# Altium footprint library 智能锁实践教学平台.PcbLib: 58 footprints (part 1 of 4)
Each footprint in its own frame and in the unit in brackets; x right, y up, seen from the top. Pads: shape width x height; smd on the part's side, far side on the other; paste and mask are expansions set on the pad; w line width, h text height; cw(c..) or ccw(c..) is an arc to the next point about the centre after c.
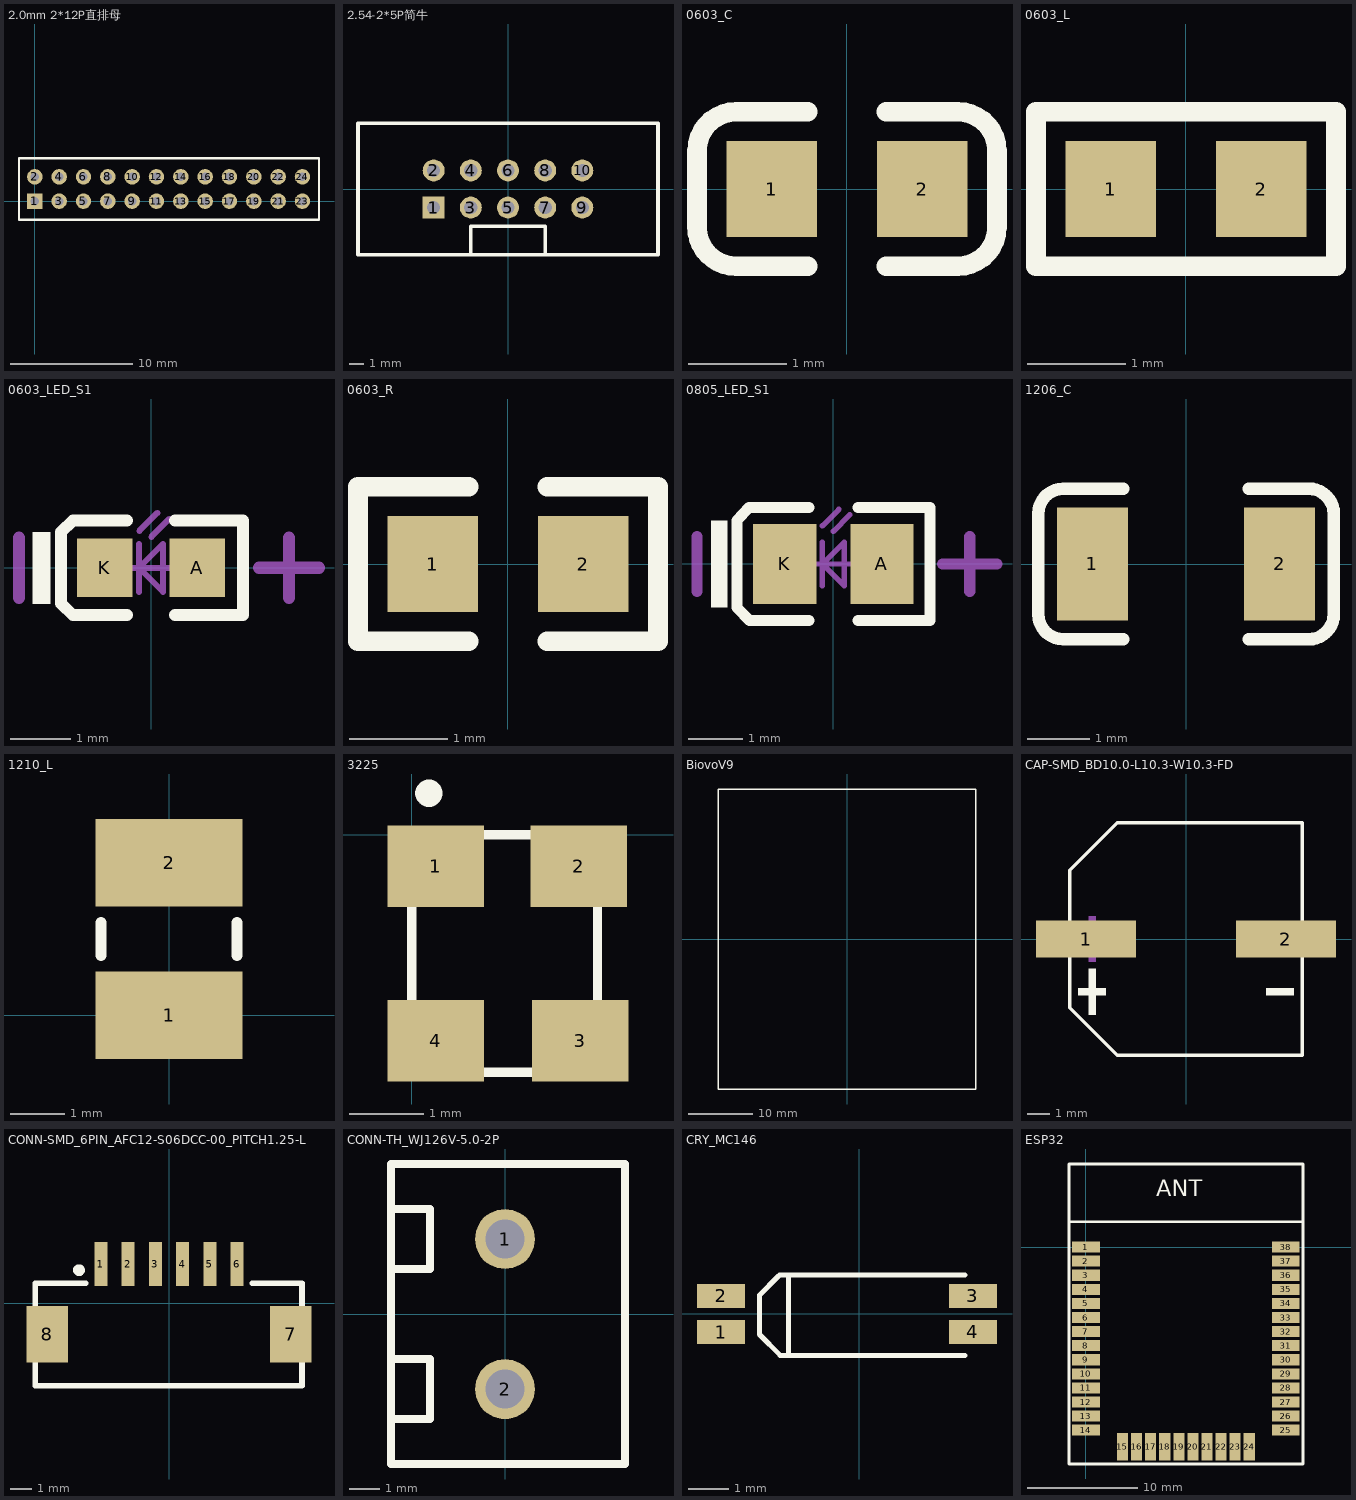
[diagram p0: the footprints below, top view; thin cyan lines are the x and y axes]

## 2.0mm 2*12P直排母 [mm]
pads (24):
  rect 1.27x1.27 / inner round 1.524 / far side rect 1.27x1.27 hole 0.7: 1(0,0)
  round 1.27 / inner round 1.524 / far side round 1.27 hole 0.7: 2(0,2) 3(2,0) 4(2,2) 5(4,0) 6(4,2) 7(6,0) 8(6,2) 9(8,0) 10(8,2) 11(10,0) 12(10,2) 13(12,0) 14(12,2) 15(14,0) 16(14,2) 17(16,0) 18(16,2) 19(18,0) 20(18,2) 21(20,0) 22(20,2) 23(22,0) 24(22,2)
Top Overlay:
  lines w0.203: -1.3,-1.54 -1.3,3.54 23.361,3.54 23.361,-1.54 -1.3,-1.54

## 2.54-2*5P简牛 [mm]
pads (10):
  rect 1.5x1.5 hole 0.9: 1(-5.08,-1.27)
  round 1.5 hole 0.9: 2(-5.08,1.27) 3(-2.54,-1.27) 4(-2.54,1.27) 5(0,-1.27) 6(0,1.27) 7(2.54,-1.27) 8(2.54,1.27) 9(5.08,-1.27) 10(5.08,1.27)
Top Overlay:
  lines w0.254: -2.54,-4.5 -2.54,-2.54 2.54,-2.54 2.54,-4.5 ; -10.25,-4.5 10.25,-4.5 10.25,4.5 -10.25,4.5 -10.25,-4.5

## 0603_C [mm]
pads (2):
  rect 0.93x0.98 smd: 1(-0.77,0) 2(0.77,0)
Top Overlay:
  lines w0.2: -0.4,-0.79 -1.135,-0.79 cw(c-1.135,-0.39) -1.535,-0.39 -1.535,0.39 cw(c-1.135,0.39) -1.135,0.79 -0.4,0.79 ; 0.4,-0.79 1.135,-0.79 ccw(c1.135,-0.39) 1.535,-0.39 1.535,0.39 ccw(c1.135,0.39) 1.135,0.79 0.4,0.79
3D body: height 0.3, standoff 0, extent -0.8,-0.4 0.8,0.4

## 0603_L [mm]
height 12
pads (2):
  rect 0.93x0.98 smd: 1(-0.77,0) 2(0.77,0)
Top Overlay:
  lines w0.2: -1.535,-0.79 1.535,-0.79 1.535,0.79 -1.535,0.79 -1.535,-0.79
3D body: height 0.46, standoff -0.01, extent -0.825,-0.412 0.825,0.413

## 0603_LED_S1 [mm]
height 12
pads (2):
  rect 0.93x0.98 smd: A(0.77,0) K(-0.77,0)
Top Overlay:
  rectangle: -1.975,-0.6 -1.675,0.6
  lines w0.2: -0.4,-0.79 -1.3,-0.79 -1.5,-0.597 -1.5,0.597 -1.3,0.79 -0.4,0.79 ; 0.4,-0.79 1.535,-0.79 1.535,0.79 0.4,0.79
Mechanical 13:
  lines w0.1: -0.4,0 0.4,0 ; -0.2,-0.4 -0.2,0.4 ; -0.195,0.617 0.105,0.917 ; 0.005,0.517 0.305,0.817 ; -0.2,0 0.2,-0.4 0.2,0.4 -0.2,0
Mechanical 15:
  lines w0.203: -2.2,-0.5 -2.2,0.5 ; 1.8,0 2.8,0 ; 2.3,-0.5 2.3,0.5
3D body: height 0.6, standoff 0, extent -0.8,-0.4 0.8,0.4

## 0603_R [mm]
pads (2):
  rect 0.93x0.98 smd: 1(-0.77,0) 2(0.77,0)
Top Overlay:
  lines w0.2: -0.4,-0.79 -1.535,-0.79 -1.535,0.79 -0.4,0.79 ; 0.4,-0.79 1.535,-0.79 1.535,0.79 0.4,0.79
3D body: height 0.56, standoff 0, extent -0.85,-0.4 0.85,0.4

## 0805_LED_S1 [mm]
pads (2):
  rect 1.16x1.47 smd: A(0.89,0) K(-0.89,0)
Top Overlay:
  rectangle: -2.245,-0.8 -1.945,0.8
  lines w0.2: -0.45,-1.035 -1.535,-1.035 -1.77,-0.8 -1.77,0.8 -1.55,1.035 -0.45,1.035 ; 0.45,-1.035 1.77,-1.035 1.77,1.035 0.45,1.035
Mechanical 13:
  lines w0.1: -0.4,0 0.4,0 ; -0.2,-0.4 -0.2,0.4 ; -0.2,0.7 0.1,1 ; 0,0.6 0.3,0.9 ; -0.2,0 0.2,0.4 0.2,-0.4 -0.2,0
Mechanical 15:
  lines w0.203: -2.5,-0.5 -2.5,0.5 ; 2,0 3,0 ; 2.5,-0.5 2.5,0.5
3D body: height 1.1, standoff 0, extent -1.01,-0.625 1.01,0.625

## 1206_C [mm]
pads (2):
  rect 1.13x1.8 smd: 1(-1.49,0) 2(1.49,0)
Top Overlay:
  lines w0.2: -1,-1.2 -1.955,-1.2 cw(c-1.955,-0.8) -2.355,-0.8 -2.355,0.8 cw(c-1.955,0.8) -1.955,1.2 -1,1.2 ; 1,-1.2 1.955,-1.2 ccw(c1.955,-0.8) 2.355,-0.8 2.355,0.8 ccw(c1.955,0.8) 1.955,1.2 1,1.2
3D body: height 1, standoff 0, extent -1.602,-0.813 1.598,0.787

## 1210_L [mm]
pads (2):
  rect 2.7x1.6 smd: 1(0,0) 2(0,2.8)
Top Overlay:
  lines w0.2: -1.25,1.1 -1.25,1.7 ; 1.25,1.1 1.25,1.7

## 3225 [mm]
height 12
pads (4):
  rect 1.3x1.1 smd: 1(0.325,-0.425) 2(2.25,-0.425) 3(2.265,-2.775) 4(0.325,-2.775)
Top Overlay:
  circle w0.254: c0.229,0.559 r0.057
  lines w0.127: 0,-3.2 0,0 2.5,0 2.5,-3.2 0,-3.2

## BiovoV9 [mm]
Top Overlay:
  lines w0.203: -20.2,-23.5 20.2,-23.5 20.2,23.5 -20.2,23.5 -20.2,-23.5

## CAP-SMD_BD10.0-L10.3-W10.3-FD [mm]
pads (2):
  rect 4.5x1.65 smd: 1(-4.5,0) 2(4.5,0)
Top Overlay:
  region: 4.841,-2.214 4.841,-2.523 3.605,-2.523 3.605,-2.214
  region: -4.841,-2.214 -4.841,-2.523 -3.605,-2.523 -3.605,-2.214
  region: -4.378,-1.339 -4.378,-3.399 -4.068,-3.399 -4.068,-1.339
  lines w0.152: -5.226,-0.852 -5.226,-3.09 -3.09,-5.226 5.226,-5.226 5.226,-0.852 ; -5.226,0.852 -5.226,3.09 -3.09,5.226 5.226,5.226 5.226,0.852
Mechanical 15:
  region: 4.841,0.155 4.841,-0.155 3.605,-0.155 3.605,0.155
  region: -4.841,0.155 -4.841,-0.155 -3.605,-0.155 -3.605,0.155
  region: -4.378,1.03 -4.378,-1.03 -4.068,-1.03 -4.068,1.03

## CONN-SMD_6PIN_AFC12-S06DCC-00_PITCH1.25-L [mm]
pads (8):
  rect 0.6x2 smd: 1(-3.125,1.798) 2(-1.875,1.798) 3(-0.625,1.798) 4(0.625,1.798) 5(1.875,1.798) 6(3.125,1.798)
  rect 1.9x2.6 smd: 7(5.575,-1.417) 8(-5.575,-1.417)
Top Overlay:
  circle w0.254: c-4.125,1.518 r0.141
  lines w0.254: -3.826,0.917 -6.125,0.917 -6.125,-3.782 6.095,-3.782 6.095,0.917 3.826,0.917

## CONN-TH_WJ126V-5.0-2P [mm]
pads (2):
  round 2 hole 1.3: 1(0,2.501) 2(0,-2.501)
Top Overlay:
  lines w0.254: -3.8,-3.499 -2.5,-3.499 -2.5,-1.499 -3.8,-1.499 ; -3.8,1.501 -2.5,1.501 -2.5,3.501 -3.8,3.501 ; -3.8,-4.999 0,-4.999 4,-4.999 4,5.001 0,5.001 -3.8,5.001 -3.8,-4.999

## CRY_MC146 [mm]
pads (4):
  rect 1.2x0.6 smd: 1(-3.45,-0.46) 2(-3.45,0.44) 3(2.85,0.44) 4(2.85,-0.46)
Top Overlay:
  lines w0.127: -2.01,0.94 -2.49,0.46 -2.49,-0.52 -1.97,-1.04 ; -1.99,0.96 2.645,0.96 ; -1.98,-1.044 2.645,-1.044 ; -1.76,-1.04 -1.76,0.96

## ESP32 [mm]
pads (38):
  rect 2.5x1 smd: 1(0,0) 2(0,-1.27) 3(0,-2.54) 4(0,-3.81) 5(0,-5.08) 6(0,-6.35) 7(0,-7.62) 8(0,-8.89) 9(0,-10.16) 10(0,-11.43) 11(0,-12.7) 12(0,-13.97) 13(0,-15.24) 14(0,-16.51) 25(18,-16.51) 26(18,-15.24) 27(18,-13.97) 28(18,-12.7) 29(18,-11.43) 30(18,-10.16) 31(18,-8.89) 32(18,-7.62) 33(18,-6.35) 34(18,-5.08) 35(18,-3.81) 36(18,-2.54) 37(18,-1.27) 38(18,0)
  rect 1x2.5 smd: 15(3.29,-18.01) 16(4.56,-18.01) 17(5.83,-18.01) 18(7.1,-18.01) 19(8.37,-18.01) 20(9.64,-18.01) 21(10.91,-18.01) 22(12.18,-18.01) 23(13.45,-18.01) 24(14.72,-18.01)
Top Overlay:
  lines w0.254: -1.524,2.29 19.558,2.29 ; -1.524,-19.558 19.558,-19.558 19.558,7.49 -1.524,7.49 -1.524,-19.558
  text "ANT" at 6.35,4.064 h2.54